# Altium footprint library SWARMUS_LIB.PcbLib: 114 footprints (part 5 of 8)
Each footprint in its own frame and in the unit in brackets; x right, y up, seen from the top. Pads: shape width x height; smd on the part's side, far side on the other; paste and mask are expansions set on the pad; w line width, h text height; cw(c..) or ccw(c..) is an arc to the next point about the centre after c.
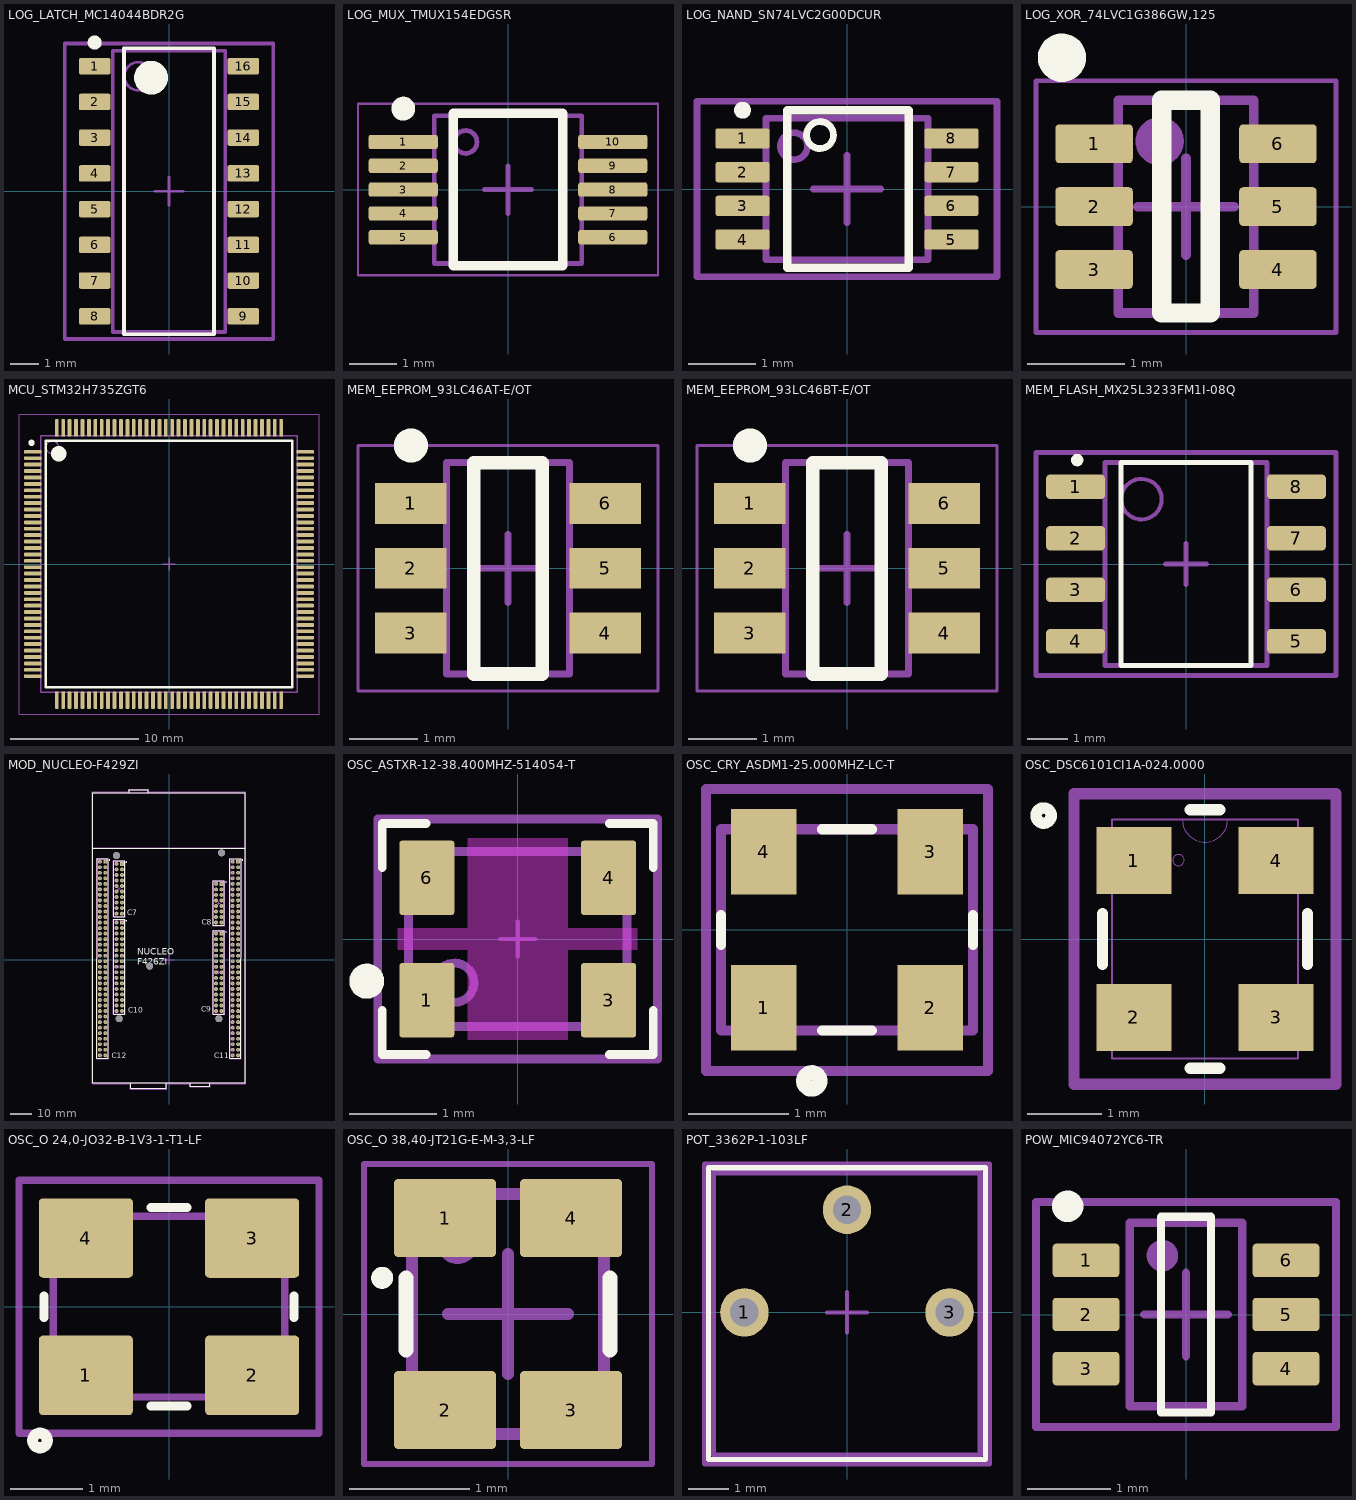
[diagram p4: the footprints below, top view; thin cyan lines are the x and y axes]

## LOG_LATCH_MC14044BDR2G [mm] "SOIC, 16-Leads, Body 9.90x3.90mm, Pitch 1.27mm, IPC Medium Density"
height 1.75
pads (16):
  rrect20% 1.12x0.58 smd paste-0.05 mask+0.07: 1(-2.64,4.445) 2(-2.64,3.175) 3(-2.64,1.905) 4(-2.64,0.635) 5(-2.64,-0.635) 6(-2.64,-1.905) 7(-2.64,-3.175) 8(-2.64,-4.445) 9(2.64,-4.445) 10(2.64,-3.175) 11(2.64,-1.905) 12(2.64,-0.635) 13(2.64,0.635) 14(2.64,1.905) 15(2.64,3.175) 16(2.64,4.445)
Top Overlay:
  circle w0.6: c-0.636,4.036 r0.3
  circle w0.25: c-2.64,5.285 r0.125
  lines w0.127: -1.6,-5.075 1.6,-5.075 1.6,5.075 -1.6,5.075 -1.6,-5.075
Top Assembly Drawing:
  circle w0.1: c-1.087,4.086 r0.5
  lines w0.127: -2,-5 -2,5 2,5 2,-5 -2,-5
Top Courtyard:
  lines w0.1: -0.5,0 0.5,0 ; 0,-0.5 0,0.5
  lines w0.127: -3.7,-5.25 3.7,-5.25 3.7,5.25 -3.7,5.25 -3.7,-5.25
3D body "SOIC127P600X175-16N.step": height 1.75, standoff 0, extent -3,-5 3,5

## LOG_MUX_TMUX154EDGSR [mm] "TSSOP, 10-Leads, Body 3.00x3.00mm, Pitch 0.50mm, IPC Medium Density"
height 1.1
pads (10):
  rrect30% 1.45x0.3 smd paste-0.025 mask+0.05: 1(-2.2,1) 2(-2.2,0.5) 3(-2.2,0) 4(-2.2,-0.5) 5(-2.2,-1) 6(2.2,-1) 7(2.2,-0.5) 8(2.2,0) 9(2.2,0.5) 10(2.2,1)
Top Overlay:
  circle w0.25: c-2.2,1.7 r0.125
  lines w0.2: -1.15,-1.6 1.15,-1.6 1.15,1.6 -1.15,1.6 -1.15,-1.6
Bottom Assembly Drawing:
  circle w0.1: c-0.89,1 r0.24
  lines w0.1: -1.55,-1.55 -1.55,1.55 1.55,1.55 1.55,-1.55 -1.55,-1.55
Top Courtyard:
  lines w0.05: -3.15,-1.8 3.15,-1.8 3.15,1.8 -3.15,1.8 -3.15,-1.8
  lines w0.1: -0.5,0 0.5,0 ; 0,-0.5 0,0.5
3D body "TSSOP50P490X110-10N.step": height 1.1, standoff 0, extent -2.45,-1.55 2.45,1.55

## LOG_NAND_SN74LVC2G00DCUR [mm] "SN74LVC2G00"
height 0.9
pads (8):
  rrect20% 0.8x0.3 smd paste-0.05 mask+0.05: 1(-1.55,0.75) 2(-1.55,0.25) 3(-1.55,-0.25) 4(-1.55,-0.75) 5(1.55,-0.75) 6(1.55,-0.25) 7(1.55,0.25) 8(1.55,0.75)
Top Overlay:
  circle w0.1: c-0.4,0.8 r0.2
  circle w0.127: c-1.549,1.168 r0.062
  lines w0.127: -0.889,-1.168 0.914,-1.168 0.914,1.168 -0.889,1.168 -0.889,-1.168
Top Assembly Drawing:
  circle w0.1: c-0.787,0.635 r0.2
  lines w0.1: -1.2,-1.05 1.2,-1.05 1.2,1.05 -1.2,1.05 -1.2,-1.05
Top Courtyard:
  lines w0.1: -0.5,0 0.5,0 ; 0,-0.5 0,0.5 ; -2.225,-1.3 2.225,-1.3 2.225,1.3 -2.225,1.3 -2.225,-1.3
3D body "COM_LEV_SN74LVC2G00.step": height 0.9, standoff 0, extent -1.549,-1.05 1.549,1.05

## LOG_XOR_74LVC1G386GW,125 [mm] "6-TTSOP"
height 1.1
pads (6):
  rrect20% 0.8x0.4 smd paste-0.025 mask+0.05: 1(-0.95,0.65) 2(-0.95,0) 3(-0.95,-0.65) 4(0.95,-0.65) 5(0.95,0) 6(0.95,0.65)
Top Overlay:
  circle w0.25: c-1.281,1.539 r0.125
  lines w0.2: -0.25,-1.1 0.25,-1.1 0.25,1.1 -0.25,1.1 -0.25,-1.1
Top Assembly Drawing:
  circle w0.25: c-0.272,0.676 r0.125
  lines w0.1: -0.7,-1.1 0.7,-1.1 0.7,1.1 -0.7,1.1 -0.7,-1.1
Top Courtyard:
  lines w0.05: -1.55,-1.3 1.55,-1.3 1.55,1.3 -1.55,1.3 -1.55,-1.3
  lines w0.1: -0.5,0 0.5,0 ; 0,-0.5 0,0.5
3D body "74LVC1G386GW,125.STEP": height 1.1, standoff 0, extent -1.05,-1 1.05,1

## MCU_STM32H735ZGT6 [mm] "TSQFP, 144-Leads, Body 20,00x20,00mm"
height 1.6
pads (144):
  rrect50% 1.35x0.3 smd paste-0.025 mask+0.048: 1(-10.625,8.75) 2(-10.625,8.25) 3(-10.625,7.75) 4(-10.625,7.25) 5(-10.625,6.75) 6(-10.625,6.25) 7(-10.625,5.75) 8(-10.625,5.25) 9(-10.625,4.75) 10(-10.625,4.25) 11(-10.625,3.75) 12(-10.625,3.25) 13(-10.625,2.75) 14(-10.625,2.25) 15(-10.625,1.75) 16(-10.625,1.25) 17(-10.625,0.75) 18(-10.625,0.25) 19(-10.625,-0.25) 20(-10.625,-0.75) 21(-10.625,-1.25) 22(-10.625,-1.75) 23(-10.625,-2.25) 24(-10.625,-2.75) 25(-10.625,-3.25) 26(-10.625,-3.75) 27(-10.625,-4.25) 28(-10.625,-4.75) 29(-10.625,-5.25) 30(-10.625,-5.75) 31(-10.625,-6.25) 32(-10.625,-6.75) 33(-10.625,-7.25) 34(-10.625,-7.75) 35(-10.625,-8.25) 36(-10.625,-8.75) 73(10.625,-8.75) 74(10.625,-8.25) 75(10.625,-7.75) 76(10.625,-7.25) 77(10.625,-6.75) 78(10.625,-6.25) 79(10.625,-5.75) 80(10.625,-5.25) 81(10.625,-4.75) 82(10.625,-4.25) 83(10.625,-3.75) 84(10.625,-3.25) 85(10.625,-2.75) 86(10.625,-2.25) 87(10.625,-1.75) 88(10.625,-1.25) 89(10.625,-0.75) 90(10.625,-0.25) 91(10.625,0.25) 92(10.625,0.75) 93(10.625,1.25) 94(10.625,1.75) 95(10.625,2.25) 96(10.625,2.75) 97(10.625,3.25) 98(10.625,3.75) 99(10.625,4.25) 100(10.625,4.75) 101(10.625,5.25) 102(10.625,5.75) 103(10.625,6.25) 104(10.625,6.75) 105(10.625,7.25) 106(10.625,7.75) 107(10.625,8.25) 108(10.625,8.75)
  rrect50% 0.3x1.35 smd paste-0.025 mask+0.048: 37(-8.75,-10.625) 38(-8.25,-10.625) 39(-7.75,-10.625) 40(-7.25,-10.625) 41(-6.75,-10.625) 42(-6.25,-10.625) 43(-5.75,-10.625) 44(-5.25,-10.625) 45(-4.75,-10.625) 46(-4.25,-10.625) 47(-3.75,-10.625) 48(-3.25,-10.625) 49(-2.75,-10.625) 50(-2.25,-10.625) 51(-1.75,-10.625) 52(-1.25,-10.625) 53(-0.75,-10.625) 54(-0.25,-10.625) 55(0.25,-10.625) 56(0.75,-10.625) 57(1.25,-10.625) 58(1.75,-10.625) 59(2.25,-10.625) 60(2.75,-10.625) 61(3.25,-10.625) 62(3.75,-10.625) 63(4.25,-10.625) 64(4.75,-10.625) 65(5.25,-10.625) 66(5.75,-10.625) 67(6.25,-10.625) 68(6.75,-10.625) 69(7.25,-10.625) 70(7.75,-10.625) 71(8.25,-10.625) 72(8.75,-10.625) 109(8.75,10.625) 110(8.25,10.625) 111(7.75,10.625) 112(7.25,10.625) 113(6.75,10.625) 114(6.25,10.625) 115(5.75,10.625) 116(5.25,10.625) 117(4.75,10.625) 118(4.25,10.625) 119(3.75,10.625) 120(3.25,10.625) 121(2.75,10.625) 122(2.25,10.625) 123(1.75,10.625) 124(1.25,10.625) 125(0.75,10.625) 126(0.25,10.625) 127(-0.25,10.625) 128(-0.75,10.625) 129(-1.25,10.625) 130(-1.75,10.625) 131(-2.25,10.625) 132(-2.75,10.625) 133(-3.25,10.625) 134(-3.75,10.625) 135(-4.25,10.625) 136(-4.75,10.625) 137(-5.25,10.625) 138(-5.75,10.625) 139(-6.25,10.625) 140(-6.75,10.625) 141(-7.25,10.625) 142(-7.75,10.625) 143(-8.25,10.625) 144(-8.75,10.625)
Top Overlay:
  circle w0.6: c-8.6,8.6 r0.3
  circle w0.25: c-10.725,9.45 r0.125
  lines w0.2: -9.6,-9.6 9.6,-9.6 9.6,9.6 -9.6,9.6 -9.6,-9.6
Top Assembly Drawing:
  circle w0.1: c-9.1,9.1 r0.5
  lines w0.1: -10,-10 10,-10 10,10 -10,10 -10,-10
Top Courtyard:
  lines w0.05: -11.7,-11.7 11.7,-11.7 11.7,11.7 -11.7,11.7 -11.7,-11.7
  lines w0.1: -0.5,0 0.5,0 ; 0,-0.5 0,0.5
3D body "TSQFP50P2200X2200X160-144N.step": height 1.6, standoff 0, extent -11,-11 11,11

## MEM_EEPROM_93LC46AT-E/OT [mm] "SOT23-6 for EEPROM"
height 1.45
pads (6):
  rect 1.05x0.6 smd paste-0.05 mask+0.05: 1(-1.425,0.95) 2(-1.425,0) 3(-1.425,-0.95) 4(1.425,-0.95) 5(1.425,0) 6(1.425,0.95)
Top Overlay:
  circle w0.25: c-1.425,1.8 r0.125
  lines w0.2: -0.5,-1.55 0.5,-1.55 0.5,1.55 -0.5,1.55 -0.5,-1.55
Top Assembly Drawing:
  lines w0.1: -0.9,-1.55 -0.9,1.55 0.9,1.55 0.9,-1.55 -0.9,-1.55
Top Courtyard:
  lines w0.05: -2.2,-1.8 -2.2,1.8 2.2,1.8 2.2,-1.8 -2.2,-1.8
  lines w0.1: -0.5,0 0.5,0 ; 0,-0.5 0,0.5
3D body "SOT-23-6_MC_MCH.step": height 1.45, standoff 0, extent -1.6,-1.549 1.6,1.549

## MEM_EEPROM_93LC46BT-E/OT [mm] "SOT23-6 for EEPROM"
height 1.45
pads (6):
  rect 1.05x0.6 smd paste-0.05 mask+0.05: 1(-1.425,0.95) 2(-1.425,0) 3(-1.425,-0.95) 4(1.425,-0.95) 5(1.425,0) 6(1.425,0.95)
Top Overlay:
  circle w0.25: c-1.425,1.8 r0.125
  lines w0.2: -0.5,-1.55 0.5,-1.55 0.5,1.55 -0.5,1.55 -0.5,-1.55
Top Assembly Drawing:
  lines w0.1: -0.9,-1.55 -0.9,1.55 0.9,1.55 0.9,-1.55 -0.9,-1.55
Top Courtyard:
  lines w0.05: -2.2,-1.8 -2.2,1.8 2.2,1.8 2.2,-1.8 -2.2,-1.8
  lines w0.1: -0.5,0 0.5,0 ; 0,-0.5 0,0.5
3D body "SOT-23-6_MC_MCH.step": height 1.45, standoff 0, extent -1.6,-1.549 1.6,1.549

## MEM_FLASH_MX25L3233FM1I-08Q [mm] "SOIC, 8-Leads, Body 4,90x3,90mm, Pitch 1,27mm, IPC Medium Density"
height 1.75
pads (8):
  rrect30% 1.45x0.6 smd paste-0.025 mask+0.07: 1(-2.725,1.905) 2(-2.725,0.635) 3(-2.725,-0.635) 4(-2.725,-1.905) 5(2.725,-1.905) 6(2.725,-0.635) 7(2.725,0.635) 8(2.725,1.905)
Top Overlay:
  circle w0.152: c-2.683,2.563 r0.076
  lines w0.127: -1.6,-2.5 1.6,-2.5 1.6,2.5 -1.6,2.5 -1.6,-2.5
Top Assembly Drawing:
  circle w0.1: c-1.1,1.6 r0.5
  lines w0.127: -2,-2.5 2,-2.5 2,2.5 -2,2.5 -2,-2.5
Top Courtyard:
  lines w0.127: -0.5,0 0.5,0 ; 0,-0.5 0,0.5 ; -3.7,-2.75 3.7,-2.75 3.7,2.75 -3.7,2.75 -3.7,-2.75
3D body "SOIC127P600X175-8N.step": height 1.75, standoff 0, extent -3,-2.5 3,2.5

## MOD_NUCLEO-F429ZI [mm]
pads (249):
  round 3.2 hole 3.2 unplated: 0(-24.13,47.909) 0(-22.86,-27.021) 0(-8.89,-2.891) 0(22.86,-27.021) 0(24.13,49.179)
  rect 1.8x1.8 hole 1: CN7-1(-21.59,44.099) CN8-1(24.13,34.93) CN9-1(24.13,12.07) CN10-1(-21.59,17.175) CN11-1(31.75,45.09) CN12-1(-29.21,45.09)
  round 1.8 hole 1: CN7-2(-24.13,44.099) CN7-3(-21.59,41.559) CN7-4(-24.13,41.559) CN7-5(-21.59,39.019) CN7-6(-24.13,39.019) CN7-7(-21.59,36.479) CN7-8(-24.13,36.479) CN7-9(-21.59,33.939) CN7-10(-24.13,33.939) CN7-11(-21.59,31.399) CN7-12(-24.13,31.399) CN7-13(-21.59,28.859) CN7-14(-24.13,28.859) CN7-15(-21.59,26.319) CN7-16(-24.13,26.319) CN7-17(-21.59,23.779) CN7-18(-24.13,23.779) CN7-19(-21.59,21.239) CN7-20(-24.13,21.239) CN8-2(21.59,34.93) CN8-3(24.13,32.39) CN8-4(21.59,32.39) CN8-5(24.13,29.85) CN8-6(21.59,29.85) CN8-7(24.13,27.31) CN8-8(21.59,27.31) CN8-9(24.13,24.77) CN8-10(21.59,24.77) CN8-11(24.13,22.23) CN8-12(21.59,22.23) CN8-13(24.13,19.69) CN8-14(21.59,19.69) CN8-15(24.13,17.15) CN8-16(21.59,17.15) CN9-2(21.59,12.07) CN9-3(24.13,9.53) CN9-4(21.59,9.53) CN9-5(24.13,6.99) CN9-6(21.59,6.99) CN9-7(24.13,4.45) CN9-8(21.59,4.45) CN9-9(24.13,1.91) CN9-10(21.59,1.91) CN9-11(24.13,-0.63) CN9-12(21.59,-0.63) CN9-13(24.13,-3.17) CN9-14(21.59,-3.17) CN9-15(24.13,-5.71) CN9-16(21.59,-5.71) CN9-17(24.13,-8.25) CN9-18(21.59,-8.25) CN9-19(24.13,-10.79) CN9-20(21.59,-10.79) CN9-21(24.13,-13.33) CN9-22(21.59,-13.33) CN9-23(24.13,-15.87) CN9-24(21.59,-15.87) CN9-25(24.13,-18.41) CN9-26(21.59,-18.41) CN9-27(24.13,-20.95) CN9-28(21.59,-20.95) CN9-29(24.13,-23.49) CN9-30(21.59,-23.49) CN10-2(-24.13,17.175) CN10-3(-21.59,14.635) CN10-4(-24.13,14.635) CN10-5(-21.59,12.095) CN10-6(-24.13,12.095) CN10-7(-21.59,9.555) CN10-8(-24.13,9.555) CN10-9(-21.59,7.015) CN10-10(-24.13,7.015) CN10-11(-21.59,4.475) CN10-12(-24.13,4.475) CN10-13(-21.59,1.935) CN10-14(-24.13,1.935) CN10-15(-21.59,-0.605) CN10-16(-24.13,-0.605) CN10-17(-21.59,-3.145) CN10-18(-24.13,-3.145) CN10-19(-21.59,-5.685) CN10-20(-24.13,-5.685) CN10-21(-21.59,-8.225) CN10-22(-24.13,-8.225) CN10-23(-21.59,-10.765) CN10-24(-24.13,-10.765) CN10-25(-21.59,-13.305) CN10-26(-24.13,-13.305) CN10-27(-21.59,-15.845) CN10-28(-24.13,-15.845) CN10-29(-21.59,-18.385) CN10-30(-24.13,-18.385) CN10-31(-21.59,-20.925) CN10-32(-24.13,-20.925) CN10-33(-21.59,-23.465) CN10-34(-24.13,-23.465) CN11-2(29.21,45.09) CN11-3(31.75,42.55) CN11-4(29.21,42.55) CN11-5(31.75,40.01) CN11-6(29.21,40.01) CN11-7(31.75,37.47) CN11-8(29.21,37.47) CN11-9(31.75,34.93) CN11-10(29.21,34.93) CN11-11(31.75,32.39) CN11-12(29.21,32.39) CN11-13(31.75,29.85) CN11-14(29.21,29.85) CN11-15(31.75,27.31) CN11-16(29.21,27.31) CN11-17(31.75,24.77) CN11-18(29.21,24.77) CN11-19(31.75,22.23) CN11-20(29.21,22.23) CN11-21(31.75,19.69) CN11-22(29.21,19.69) CN11-23(31.75,17.15) CN11-24(29.21,17.15) CN11-25(31.75,14.61) CN11-26(29.21,14.61) CN11-27(31.75,12.07) CN11-28(29.21,12.07) CN11-29(31.75,9.53) CN11-30(29.21,9.53) CN11-31(31.75,6.99) CN11-32(29.21,6.99) CN11-33(31.75,4.45) CN11-34(29.21,4.45) CN11-35(31.75,1.91) CN11-36(29.21,1.91) CN11-37(31.75,-0.63) CN11-38(29.21,-0.63) CN11-39(31.75,-3.17) CN11-40(29.21,-3.17) CN11-41(31.75,-5.71) CN11-42(29.21,-5.71) CN11-43(31.75,-8.25) CN11-44(29.21,-8.25) CN11-45(31.75,-10.79) CN11-46(29.21,-10.79) CN11-47(31.75,-13.33) CN11-48(29.21,-13.33) CN11-49(31.75,-15.87) CN11-50(29.21,-15.87) CN11-51(31.75,-18.41) CN11-52(29.21,-18.41) CN11-53(31.75,-20.95) CN11-54(29.21,-20.95) CN11-55(31.75,-23.49) CN11-56(29.21,-23.49) CN11-57(31.75,-26.03) CN11-58(29.21,-26.03) CN11-59(31.75,-28.57) CN11-60(29.21,-28.57) CN11-61(31.75,-31.11) CN11-62(29.21,-31.11) CN11-63(31.75,-33.65) CN11-64(29.21,-33.65) CN11-65(31.75,-36.19) CN11-66(29.21,-36.19) CN11-67(31.75,-38.73) CN11-68(29.21,-38.73) CN11-69(31.75,-41.27) CN11-70(29.21,-41.27) CN11-71(31.75,-43.81) CN11-72(29.21,-43.81) CN12-2(-31.75,45.09) CN12-3(-29.21,42.55) CN12-4(-31.75,42.55) CN12-5(-29.21,40.01) CN12-6(-31.75,40.01) CN12-7(-29.21,37.47) CN12-8(-31.75,37.47) CN12-9(-29.21,34.93) CN12-10(-31.75,34.93) CN12-11(-29.21,32.39) CN12-12(-31.75,32.39) CN12-13(-29.21,29.85) CN12-14(-31.75,29.85) CN12-15(-29.21,27.31) CN12-16(-31.75,27.31) CN12-17(-29.21,24.77) CN12-18(-31.75,24.77) CN12-19(-29.21,22.23) CN12-20(-31.75,22.23) CN12-21(-29.21,19.69) CN12-22(-31.75,19.69) CN12-23(-29.21,17.15) CN12-24(-31.75,17.15) CN12-25(-29.21,14.61) CN12-26(-31.75,14.61) CN12-27(-29.21,12.07) CN12-28(-31.75,12.07) CN12-29(-29.21,9.53) CN12-30(-31.75,9.53) CN12-31(-29.21,6.99) CN12-32(-31.75,6.99) CN12-33(-29.21,4.45) CN12-34(-31.75,4.45) CN12-35(-29.21,1.91) CN12-36(-31.75,1.91) CN12-37(-29.21,-0.63) CN12-38(-31.75,-0.63) CN12-39(-29.21,-3.17) CN12-40(-31.75,-3.17) CN12-41(-29.21,-5.71) CN12-42(-31.75,-5.71) CN12-43(-29.21,-8.25) CN12-44(-31.75,-8.25) CN12-45(-29.21,-10.79) CN12-46(-31.75,-10.79) CN12-47(-29.21,-13.33) CN12-48(-31.75,-13.33) CN12-49(-29.21,-15.87) CN12-50(-31.75,-15.87) CN12-51(-29.21,-18.41) CN12-52(-31.75,-18.41) CN12-53(-29.21,-20.95) CN12-54(-31.75,-20.95) CN12-55(-29.21,-23.49) CN12-56(-31.75,-23.49) CN12-57(-29.21,-26.03) CN12-58(-31.75,-26.03) CN12-59(-29.21,-28.57) CN12-60(-31.75,-28.57) CN12-61(-29.21,-31.11) CN12-62(-31.75,-31.11) CN12-63(-29.21,-33.65) CN12-64(-31.75,-33.65) CN12-65(-29.21,-36.19) CN12-66(-31.75,-36.19) CN12-67(-29.21,-38.73) CN12-68(-31.75,-38.73) CN12-69(-29.21,-41.27) CN12-70(-31.75,-41.27) CN12-71(-29.21,-43.81) CN12-72(-31.75,-43.81)
Top Overlay:
  circle w0.25: c-19.63,17.963 r0.127
  circle w0.25: c33.71,45.877 r0.127
  circle w0.25: c-27.25,45.877 r0.127
  circle w0.25: c-19.63,44.887 r0.127
  circle w0.25: c26.09,35.717 r0.127
  circle w0.25: c26.09,12.857 r0.127
  lines w0.178: -33.06,-45.187 -33.06,46.467 -27.9,46.467 -27.9,-45.187 -33.06,-45.187 ; -25.44,-24.841 -25.44,18.593 -20.28,18.593 -20.28,-24.841 -25.44,-24.841 ; -25.44,19.888 -25.44,45.466 -20.28,45.466 -20.28,19.888 -25.44,19.888 ; 20.28,-24.841 20.28,13.437 25.44,13.437 25.44,-24.841 20.28,-24.841 ; 20.28,15.799 20.28,36.297 25.44,36.297 25.44,15.799 20.28,15.799 ; 27.9,-45.187 27.9,46.457 33.06,46.457 33.06,-45.187 27.9,-45.187
  lines w0.508: -35,51.33 -35,-56.51 -17.474,-56.51 ; -35,51.33 -35,76.83 -18.325,76.83 ; -35,51.33 35,51.33 ; -18.325,76.83 -9.505,76.83 ; -18.325,76.83 -18.325,78.22 -9.505,78.22 -9.505,76.83 ; -17.474,-56.51 -17.474,-59.045 -1.224,-59.045 -1.224,-56.51 ; -17.474,-56.51 -1.224,-56.51 ; -9.505,76.83 35,76.83 35,51.33 ; -1.224,-56.51 9.78,-56.51 ; 9.78,-56.51 18.6,-56.51 ; 9.78,-56.51 9.78,-57.925 18.6,-57.925 18.6,-56.51 ; 18.6,-56.51 35,-56.51 35,51.33
  text "C11" at 20.875,-45.1 h2.54
  text "C8" at 14.95,16.075 h2.54
  text "C9" at 14.709,-23.895 h2.54
  text "C10" at -18.625,-24.2 h2.54
  text "C7" at -19.1,20.55 h2.54
  text "C12" at -26.4,-45.1 h2.54
  text "NUCLEO / F426ZI" at -14.543,-2.211 h3
Top Assembly Drawing:
  circle w0.127: c32.38,45.775 r0.322
  circle w0.127: c-28.534,45.877 r0.322
  circle w0.127: c-20.93,17.937 r0.322
  circle w0.127: c24.79,12.756 r0.322
  circle w0.127: c24.76,35.615 r0.322
  circle w0.127: c-20.93,44.811 r0.322
  lines w0.127: -23.495,-3.145 -22.225,-3.145 ; -23.495,32.669 -22.225,32.669 ; -22.86,-3.78 -22.86,-2.51 ; -22.86,32.034 -22.86,33.304 ; 22.225,-5.71 23.495,-5.71 ; 22.225,26.04 23.495,26.04 ; 22.86,-6.345 22.86,-5.075 ; 22.86,25.405 22.86,26.675 ; -32.957,-45.08 -28.004,-45.08 -28.003,46.36 -32.956,46.36 -32.957,-45.08 ; -25.336,-24.735 -20.383,-24.735 -20.383,18.496 -25.336,18.496 -25.336,-24.735 ; -25.336,19.969 -20.383,19.969 -20.383,45.369 -25.336,45.369 -25.336,19.969 ; 20.383,-24.76 25.336,-24.76 25.336,13.34 20.383,13.34 20.383,-24.76 ; 20.383,15.88 25.336,15.88 25.336,36.2 20.383,36.2 20.383,15.88 ; 28.004,-45.08 32.956,-45.08 32.956,46.36 28.003,46.36 28.004,-45.08
Top 3D Model:
  lines w0.127: 18,76.83 -18.325,76.83 ; -35,51.33 -35,76.83 -18.325,76.83 ; -35,51.33 -35,-56.51 -17.474,-56.51 ; -35,51.33 35,51.33 ; -18.325,76.83 -18.325,78.22 -9.505,78.22 -9.505,76.83 35,76.83 35,51.33 ; -17.474,-56.51 -17.474,-59.045 -1.224,-59.045 -1.224,-56.51 ; -17.474,-56.51 -1.224,-56.51 ; -1.224,-56.51 9.78,-56.51 ; 9.78,-56.51 18.6,-56.51 ; 9.78,-56.51 9.78,-57.9 18.6,-57.9 18.6,-56.51 ; 18.6,-56.51 35,-56.51 35,51.33
Top Courtyard:
  lines w0.127: -35.25,51.58 -35.25,-56.76 -17.725,-56.76 -17.725,-59.275 -0.95,-59.275 -0.95,-56.76 9.525,-56.76 9.525,-58.175 18.85,-58.175 18.85,-56.76 35.25,-56.76 35.25,51.58 ; -35.25,51.58 35.25,51.58 ; -35.25,51.58 -35.25,77.1 -18.575,77.1 -18.575,78.475 -9.25,78.475 -9.25,77.1 35.25,77.1 35.25,51.58 ; -33.147,-45.283 -33.147,46.563 -27.813,46.563 -27.813,-45.283 -33.147,-45.283 ; -25.527,-24.938 -20.193,-24.938 -20.193,18.674 -25.527,18.674 -25.527,-24.938 ; -25.527,19.766 -20.193,19.766 -20.193,45.547 -25.527,45.547 -25.527,19.766 ; 20.193,-24.963 25.527,-24.963 25.527,13.543 20.193,13.543 20.193,-24.963 ; 20.193,15.702 25.527,15.702 25.527,36.378 20.193,36.378 20.193,15.702 ; 27.813,-45.283 33.147,-45.283 33.147,46.538 27.813,46.538 27.813,-45.283
  lines w0.254: -2.5,0 2.5,0 ; 0,-2.5 0,2.5
3D body "NUCLEO-F429ZI--3DModel-STEP-56544.STEP": height 21.04, standoff 0.22, extent -35,-59.045 35,77.945

## OSC_ASTXR-12-38.400MHZ-514054-T [mm]
pads (4):
  rrect10% 0.63x0.85 smd paste-0.025 mask+0.07: 1(-1.04,-0.7) 3(1.04,-0.7) 4(1.04,0.7) 6(-1.04,0.7)
Top Layer keep-out:
  region: -0.57,1.15 -0.57,0.125 -1.37,0.125 -1.37,-0.125 -0.57,-0.125 -0.57,-1.15 0.57,-1.15 0.57,-0.125 1.37,-0.125 1.37,0.125 0.57,0.125 0.57,1.15
Top Overlay:
  circle w0.2: c-1.727,-0.483 r0.1
  lines w0.1: -1.549,-0.819 -1.549,-1.321 -1.049,-1.321 ; -1.549,0.819 -1.549,1.321 -1.049,1.321 ; 1.049,-1.321 1.549,-1.321 1.549,-0.819 ; 1.049,1.321 1.549,1.321 1.549,0.819
Top Assembly Drawing:
  circle w0.1: c-0.725,-0.5 r0.225
  lines w0.1: -1.25,-1 1.25,-1 1.25,1 -1.25,1 -1.25,-1
Top Courtyard:
  lines w0.05: -0.2,0 0.2,0 ; 0,-0.2 0,0.2
  lines w0.1: -1.6,-1.372 -1.6,1.372 1.6,1.372 1.6,-1.372 -1.6,-1.372
Bottom Courtyard:
  lines w0.05: -1.605,-1.375 1.605,-1.375 1.605,1.375 -1.605,1.375 -1.605,-1.375
3D body "ASTXR-12.STL.STEP": height 0.85, standoff 0, extent -1.25,-1 1.25,1

## OSC_CRY_ASDM1-25.000MHZ-LC-T [mm] "4-SMD, No Lead"
height 0.89
pads (4):
  rect 0.65x0.85 smd paste-0.025 mask+0.07: 1(-0.825,-0.775) 3(0.825,0.775) 4(-0.825,0.775)
  rect 0.65x0.85 smd: 2(0.825,-0.775)
Top Overlay:
  circle w0.152: c-0.35,-1.5 r0.08
  lines w0.1: -1.25,-0.15 -1.25,0.15 ; -0.25,-1 0.25,-1 ; -0.25,1 0.25,1 ; 1.25,-0.15 1.25,0.15
Top Assembly Drawing:
  circle w0.152: c-0.825,-0.775 r0.102
  lines w0.1: -1.25,-1 1.25,-1 1.25,1 -1.25,1 -1.25,-1
Top Courtyard:
  lines w0.1: -1.4,-1.4 1.4,-1.4 1.4,1.4 -1.4,1.4 -1.4,-1.4
3D body: height 0.85, standoff 0, extent -1.25,-1 1.25,1

## OSC_DSC6101CI1A-024.0000 [mm] "4-SMD, No Lead"
height 0.89
pads (4):
  rect 1x0.9 smd paste-0.05 mask+0.05: 1(-0.95,1.05) 2(-0.95,-1.05) 3(0.95,-1.05) 4(0.95,1.05)
Top Overlay:
  circle w0.152: c-2.159,1.651 r0.102
  lines w0.152: -1.372,-0.34 -1.372,0.34 ; -0.196,-1.727 0.196,-1.727 ; -0.196,1.727 0.196,1.727 ; 1.372,-0.34 1.372,0.34
Top Assembly Drawing:
  circle w0: c-0.356,1.054 r0.076
  lines w0: -0.305,1.6 ccw(c0,1.6) 0.305,1.6
  lines w0.025: -1.245,-1.6 -1.245,1.6 1.245,1.6 1.245,-1.6 -1.245,-1.6
Top Courtyard:
  lines w0.152: -1.753,-1.943 -1.753,1.943 1.753,1.943 1.753,-1.943 -1.753,-1.943
3D body: height 0.25, standoff 0, extent 0,0 0.254,0.254
3D body "DFN4_32X25_MCH.step": height 0.84, standoff 0, extent -1.245,-1.6 1.245,1.6

## OSC_O 24,0-JO32-B-1V3-1-T1-LF [mm] "4-SMD, No Lead"
height 0.89
pads (4):
  rrect10% 1.3x1.1 smd paste-0.05 mask+0.05: 1(-1.15,-0.95) 2(1.15,-0.95) 3(1.15,0.95) 4(-1.15,0.95)
Top Overlay:
  circle w0.152: c-1.785,-1.851 r0.102
  lines w0.127: -1.727,-0.15 -1.727,0.15 ; -0.25,-1.372 0.25,-1.372 ; -0.25,1.372 0.25,1.372 ; 1.727,-0.15 1.727,0.15
Top Assembly Drawing:
  circle w0.1: c-1.126,-0.741 r0.069
  lines w0.1: -1.6,-1.25 -1.6,1.25 1.6,1.25 1.6,-1.25 -1.6,-1.25
Top Courtyard:
  lines w0.1: -2.075,-1.75 -2.075,1.75 2.075,1.75 2.075,-1.75 -2.075,-1.75
3D body: height 1.05, standoff 0, extent -1.6,-1.245 1.6,1.245

## OSC_O 38,40-JT21G-E-M-3,3-LF [mm]
pads (4):
  rrect10% 0.85x0.65 smd paste-0.025 mask+0.04: 1(-0.525,0.8) 2(-0.525,-0.8) 3(0.525,-0.8) 4(0.525,0.8)
Top Overlay:
  circle w0.1: c-1.049,0.301 r0.042
  lines w0.127: -0.85,-0.3 -0.85,0.3 ; 0.85,-0.3 0.85,0.3
Top Assembly Drawing:
  circle w0.25: c-0.42,0.589 r0.046
  lines w0.1: -0.8,-1 0.8,-1 0.8,1 -0.8,1 -0.8,-1
Top Courtyard:
  lines w0.05: -1.2,-1.25 1.2,-1.25 1.2,1.25 -1.2,1.25 -1.2,-1.25
  lines w0.1: -0.5,0 0.5,0 ; 0,-0.5 0,0.5
3D body: height 0.7, standoff 0, extent -0.8,-1 0.8,1

## POT_3362P-1-103LF [mm]
pads (3):
  round 1.2 hole 0.7: 1(-2.54,0) 2(0,2.54) 3(2.54,0)
Top Overlay:
  lines w0.127: -3.429,-3.645 3.429,-3.645 3.429,3.579 -3.429,3.579 -3.429,-3.645
Top Assembly Drawing:
  lines w0.127: -3.304,3.453 -3.304,-3.53 3.298,-3.53 ; -3.304,3.455 3.298,3.455 ; 3.3,-3.528 3.3,3.455
Top Courtyard:
  lines w0.1: -0.5,0 0.5,0 ; 0,-0.5 0,0.5
  lines w0.127: -3.526,-3.753 -3.526,3.673 3.526,3.673 3.526,-3.753 -3.526,-3.753
3D body "3362P001XXX0A.stp": height 4.7, standoff -5.46, extent -3.302,-3.53 3.302,3.455

## POW_MIC94072YC6-TR [mm] "SOT23, 6-Leads, Body 2.00x2.10mm, Pitch 0.65mm, IPC Medium Density"
height 1.1
pads (6):
  rrect20% 0.8x0.4 smd paste-0.025 mask+0.07: 1(-1.2,0.65) 2(-1.2,0) 3(-1.2,-0.65) 4(1.2,-0.65) 5(1.2,0) 6(1.2,0.65)
Top Overlay:
  circle w0.25: c-1.42,1.299 r0.064
  lines w0.1: -0.3,-1.175 -0.3,1.175 0.3,1.175 0.3,-1.175 -0.3,-1.175
Top Assembly Drawing:
  circle w0.25: c-0.283,0.707 r0.064
  lines w0.1: -0.675,-1.1 0.675,-1.1 0.675,1.1 -0.675,1.1 -0.675,-1.1
Top Courtyard:
  lines w0.1: -0.5,0 0.5,0 ; 0,-0.5 0,0.5 ; -1.8,-1.35 1.8,-1.35 1.8,1.35 -1.8,1.35 -1.8,-1.35
3D body "SOT65P210X110-6N.step": height 1.1, standoff 0, extent -1.3,-1.1 1.3,1.1